# Altium schematic symbol library FPGA_Xilinx_Virtex6.SchLib: 28 symbols (part 5 of 21)
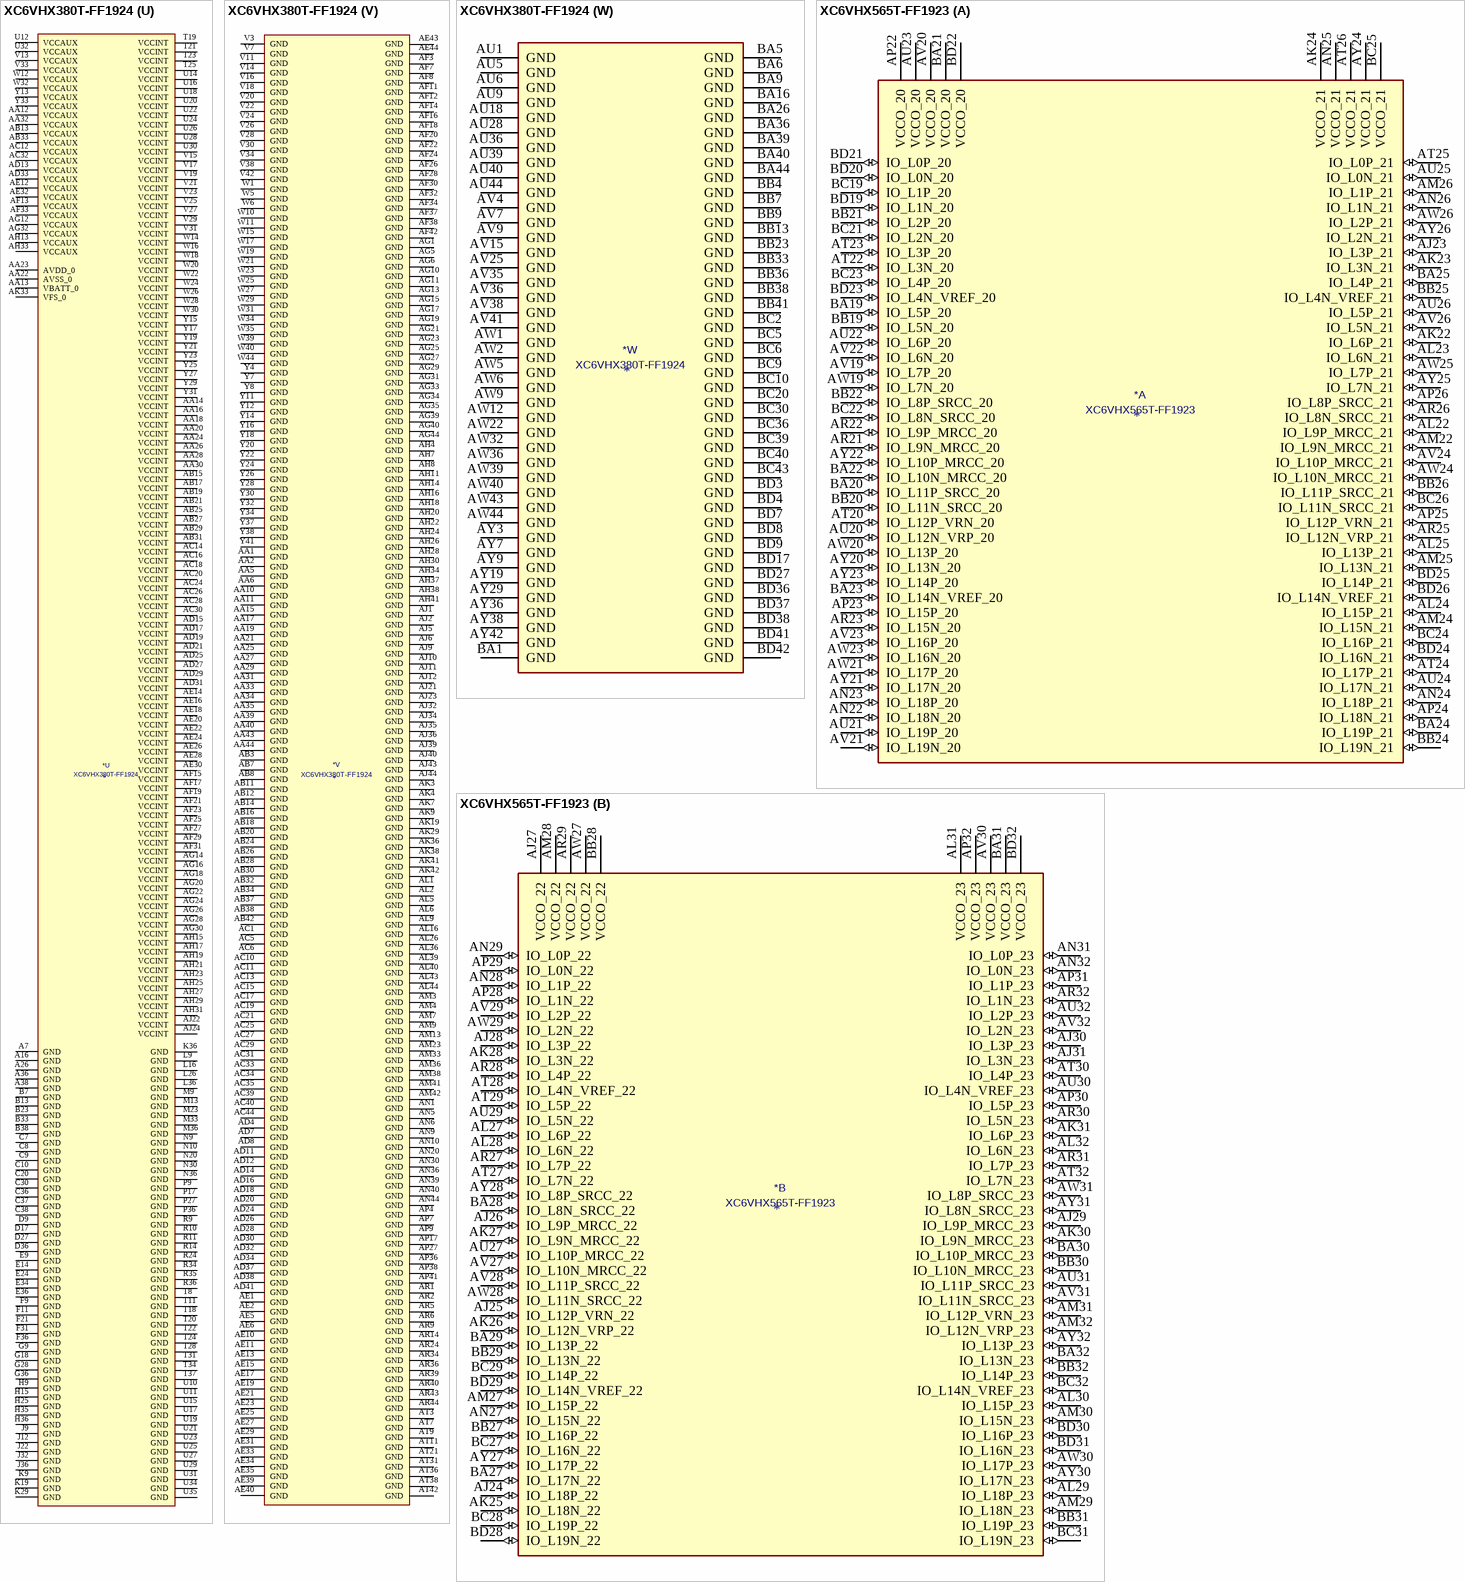
[diagram p105: symbols XC6VHX380T-FF1924 to XC6VHX565T-FF1923]

## XC6VHX380T-FF1924
designator *  value XC6VHX380T-FF1924
ki_keywords: FPGA; ki_description: Virtex 6 HXT 380 XC6VHX380T-FF1924
part A pins: AJ25 IO_L12P_VRN_22 (io), AJ26 IO_L9P_MRCC_22 (io), AJ27 VCCO_22 (power), AJ28 IO_L3P_22 (io), AK23 IO_L3P_21 (io), AK24 VCCO_21 (power), AK25 IO_L18P_22 (io), AK26 IO_L12N_VRP_22 (io), AK27 IO_L9N_MRCC_22 (io), AK28 IO_L3N_22 (io), AL23 IO_L3N_21 (io), AL24 IO_L15P_21 (io), AL25 IO_L18N_22 (io), AL27 IO_L6P_22 (io), AL28 IO_L6N_22 (io), AM24 IO_L15N_21 (io), AM25 IO_L15P_22 (io), AM26 IO_L15N_22 (io), AM27 IO_L0P_22 (io), AM28 VCCO_22 (power), AN23 IO_L6P_21 (io), AN24 IO_L18P_21 (io), AN25 VCCO_21 (power), AN26 IO_L10P_MRCC_22 (io), AN27 IO_L1P_22 (io), AN28 IO_L0N_22 (io), AP23 IO_L6N_21 (io), AP24 IO_L18N_21 (io), AP25 IO_L12P_VRN_21 (io), AP26 IO_L10N_MRCC_22 (io), AP28 IO_L1N_22 (io), AR23 IO_L9P_MRCC_21 (io), AR25 IO_L12N_VRP_21 (io), AR26 IO_L5P_22 (io), AR27 IO_L5N_22 (io), AR28 IO_L2P_22 (io), AT23 IO_L9N_MRCC_21 (io), AT24 IO_L14P_21 (io), AT25 IO_L1P_21 (io), AT26 VCCO_22 (power), AT27 IO_L7P_22 (io), AT28 IO_L2N_22 (io), AU23 VCCO_21 (power), AU24 IO_L14N_VREF_21 (io), AU25 IO_L1N_21 (io), AU26 IO_L0P_21 (io), AU27 IO_L7N_22 (io), AV23 IO_L10P_MRCC_21 (io), AV24 IO_L13P_21 (io), AV26 IO_L0N_21 (io), AV27 IO_L11P_SRCC_22 (io), AV28 IO_L4P_22 (io), AW23 IO_L10N_MRCC_21 (io), AW24 IO_L13N_21 (io), AW25 IO_L2P_21 (io), AW26 IO_L5P_21 (io), AW27 VCCO_22 (power), AW28 IO_L11N_SRCC_22 (io), AW29 IO_L4N_VREF_22 (io), AY23 IO_L11P_SRCC_21 (io), AY24 VCCO_21 (power), AY25 IO_L2N_21 (io), AY26 IO_L5N_21 (io), AY27 IO_L13P_22 (io), AY28 IO_L8P_SRCC_22 (io), BA23 IO_L11N_SRCC_21 (io), BA24 IO_L8P_SRCC_21 (io), BA25 IO_L19P_21 (io), BA27 IO_L16P_22 (io), BA28 IO_L13N_22 (io), BA29 IO_L8N_SRCC_22 (io), BB24 IO_L8N_SRCC_21 (io), BB25 IO_L19N_21 (io), BB26 IO_L7P_21 (io), BB27 IO_L16N_22 (io), BB28 VCCO_22 (power), BB29 IO_L17P_22 (io), BC23 IO_L16P_21 (io), BC24 IO_L17P_21 (io), BC25 VCCO_21 (power), BC26 IO_L7N_21 (io), BC27 IO_L14P_22 (io), BC28 IO_L19P_22 (io), BC29 IO_L17N_22 (io), BD23 IO_L16N_21 (io), BD24 IO_L17N_21 (io), BD25 IO_L4P_21 (io), BD26 IO_L4N_VREF_21 (io), BD28 IO_L14N_VREF_22 (io), BD29 IO_L19N_22 (io)
part B pins: AJ29 IO_L9P_MRCC_23 (io), AJ30 IO_L9N_MRCC_23 (io), AJ31 IO_L3P_23 (io), AK30 IO_L6P_23 (io), AK31 IO_L3N_23 (io), AK34 VCCO_24 (power), AK35 IO_L3P_D13_24 (io), AL29 IO_L12P_VRN_23 (io), AL30 IO_L6N_23 (io), AL31 VCCO_23 (power), AL32 IO_L18P_24 (io), AL33 IO_L9P_MRCC_24 (io), AL34 IO_L6P_D7_24 (io), AL35 IO_L3N_D12_24 (io), AM29 IO_L18P_23 (io), AM30 IO_L12N_VRP_23 (io), AM31 IO_L15P_23 (io), AM32 IO_L18N_24 (io), AM34 IO_L9N_MRCC_24 (io), AM35 IO_L6N_D6_24 (io), AN29 IO_L18N_23 (io), AN31 IO_L15N_23 (io), AN32 IO_L15P_FWE_B_24 (io), AN33 IO_L15N_RS1_24 (io), AN34 IO_L12P_D3_24 (io), AN35 VCCO_24 (power), AP29 IO_L1P_23 (io), AP30 IO_L1N_23 (io), AP31 IO_L0P_23 (io), AP32 VCCO_24 (power), AP33 IO_L0P_GC_24 (io), AP34 IO_L0N_GC_24 (io), AP35 IO_L12N_D2_FS2_24 (io), AR29 VCCO_23 (power), AR30 IO_L4P_23 (io), AR31 IO_L0N_23 (io), AR32 IO_L8P_SRCC_24 (io), AR33 IO_L1P_GC_24 (io), AR35 IO_L2P_D15_24 (io), AT29 IO_L7P_23 (io), AT30 IO_L4N_VREF_23 (io), AT32 IO_L8N_SRCC_24 (io), AT33 IO_L1N_GC_24 (io), AT34 IO_L5P_D9_24 (io), AT35 IO_L2N_D14_24 (io), AU29 IO_L14P_23 (io), AU30 IO_L7N_23 (io), AU31 IO_L2P_23 (io), AU32 IO_L5P_23 (io), AU33 VCCO_24 (power), AU34 IO_L4P_D11_24 (io), AU35 IO_L5N_D8_24 (io), AV29 IO_L14N_VREF_23 (io), AV30 VCCO_23 (power), AV31 IO_L2N_23 (io), AV32 IO_L5N_23 (io), AV33 IO_L7P_D5_24 (io), AV34 IO_L4N_VREF_D10_24 (io), AW30 IO_L16P_23 (io), AW31 IO_L11P_SRCC_23 (io), AW33 IO_L14P_FCS_B_24 (io), AW34 IO_L7N_D4_24 (io), AW35 IO_L10P_MRCC_24 (io), AY30 IO_L16N_23 (io), AY31 IO_L11N_SRCC_23 (io), AY32 IO_L8P_SRCC_23 (io), AY33 IO_L14N_VREF_FOE_B_MOSI_24 (io), AY34 VCCO_24 (power), AY35 IO_L10N_MRCC_24 (io), BA30 IO_L17P_23 (io), BA31 VCCO_23 (power), BA32 IO_L8N_SRCC_23 (io), BA33 IO_L13P_D1_FS1_24 (io), BA34 IO_L13N_D0_FS0_24 (io), BA35 IO_L11P_SRCC_24 (io), BB30 IO_L17N_23 (io), BB31 IO_L10P_MRCC_23 (io), BB32 IO_L13P_23 (io), BB34 IO_L16P_RS0_24 (io), BB35 IO_L11N_SRCC_24 (io), BC31 IO_L10N_MRCC_23 (io), BC32 IO_L13N_23 (io), BC33 IO_L19P_24 (io), BC34 IO_L16N_CSO_B_24 (io), BC35 VCCO_24 (power), BD30 IO_L19P_23 (io), BD31 IO_L19N_23 (io), BD32 VCCO_23 (power), BD33 IO_L19N_24 (io), BD34 IO_L17P_VRN_24 (io), BD35 IO_L17N_VRP_24 (io)
part C pins: A30 IO_L1N_26 (io), A31 VCCO_26 (power), A32 IO_L0N_26 (io), A33 IO_L5N_26 (io), A34 IO_L0P_25 (io), A35 IO_L0N_25 (io), A37 IO_L2N_SM8N_25 (io), B30 IO_L1P_26 (io), B31 IO_L0P_26 (io), B32 IO_L5P_26 (io), B34 IO_L7N_SM12N_25 (io), B35 IO_L1P_25 (io), B36 IO_L1N_25 (io), B37 IO_L2P_SM8P_25 (io), C31 IO_L7N_26 (io), C32 IO_L2P_26 (io), C33 IO_L2N_26 (io), C34 IO_L7P_SM12P_25 (io), C35 VCCO_25 (power), D30 IO_L4N_VREF_26 (io), D31 IO_L7P_26 (io), D32 VCCO_26 (power), D33 IO_L8P_SRCC_25 (io), D34 IO_L8N_SRCC_25 (io), D35 IO_L5N_SM10N_25 (io), E30 IO_L4P_26 (io), E31 IO_L11P_SRCC_26 (io), E32 IO_L11N_SRCC_26 (io), E33 IO_L13N_SM14N_25 (io), E35 IO_L5P_SM10P_25 (io), F30 IO_L13N_26 (io), F32 IO_L8N_SRCC_26 (io), F33 IO_L13P_SM14P_25 (io), F34 IO_L14N_VREF_25 (io), F35 IO_L11N_SRCC_25 (io), G30 IO_L13P_26 (io), G31 IO_L8P_SRCC_26 (io), G32 IO_L17N_26 (io), G33 VCCO_25 (power), G34 IO_L14P_25 (io), G35 IO_L11P_SRCC_25 (io), H30 VCCO_26 (power), H31 IO_L17P_26 (io), H32 IO_L10N_MRCC_26 (io), H33 IO_L19N_GC_25 (io), H34 IO_L17N_25 (io), J30 IO_L19N_26 (io), J31 IO_L10P_MRCC_26 (io), J33 IO_L19P_GC_25 (io), J34 IO_L17P_25 (io), J35 IO_L6N_SM11N_25 (io), K30 IO_L19P_26 (io), K31 IO_L14N_VREF_26 (io), K32 IO_L16N_26 (io), K33 IO_L3N_SM9N_25 (io), K34 VCCO_25 (power), K35 IO_L6P_SM11P_25 (io), L30 IO_L14P_26 (io), L31 VCCO_26 (power), L32 IO_L16P_26 (io), L33 IO_L3P_SM9P_25 (io), L34 IO_L16N_VRP_25 (io), L35 IO_L10N_MRCC_25 (io), M29 IO_L6N_26 (io), M30 IO_L3P_26 (io), M31 IO_L3N_26 (io), M32 IO_L12N_VRP_26 (io), M34 IO_L16P_VRN_25 (io), M35 IO_L10P_MRCC_25 (io), N29 IO_L6P_26 (io), N31 IO_L12P_VRN_26 (io), N32 IO_L12N_SM13N_25 (io), N33 IO_L9P_MRCC_25 (io), N34 IO_L9N_MRCC_25 (io), N35 VCCO_25 (power), P29 IO_L9N_MRCC_26 (io), P30 IO_L15N_26 (io), P31 IO_L12P_SM13P_25 (io), P32 VCCO_25 (power), P33 IO_L15N_SM15N_25 (io), P34 IO_L4P_25 (io), P35 IO_L4N_VREF_25 (io), R28 IO_L9P_MRCC_26 (io), R29 VCCO_26 (power), R30 IO_L15P_26 (io), R31 IO_L18P_GC_25 (io), R32 IO_L18N_GC_25 (io), R33 IO_L15P_SM15P_25 (io), T29 IO_L18P_26 (io), T30 IO_L18N_26 (io)
part D pins: A23 IO_L8P_SRCC_28 (io), A24 IO_L8N_SRCC_28 (io), A25 IO_L7N_28 (io), A27 IO_L0N_27 (io), A28 IO_L1P_27 (io), A29 IO_L1N_27 (io), B24 IO_L5N_28 (io), B25 IO_L7P_28 (io), B26 IO_L2N_28 (io), B27 IO_L0P_27 (io), B28 VCCO_27 (power), B29 IO_L5N_27 (io), C23 IO_L5P_28 (io), C24 IO_L4N_VREF_28 (io), C25 VCCO_28 (power), C26 IO_L2P_28 (io), C27 IO_L2P_27 (io), C28 IO_L2N_27 (io), C29 IO_L5P_27 (io), D23 IO_L4P_28 (io), D24 IO_L1N_28 (io), D25 IO_L10N_MRCC_28 (io), D26 IO_L11N_SRCC_28 (io), D28 IO_L8P_SRCC_27 (io), D29 IO_L8N_SRCC_27 (io), E23 IO_L1P_28 (io), E25 IO_L10P_MRCC_28 (io), E26 IO_L11P_SRCC_28 (io), E27 IO_L4N_VREF_27 (io), E28 IO_L7N_27 (io), E29 VCCO_27 (power), F23 IO_L0P_28 (io), F24 IO_L0N_28 (io), F25 IO_L17N_28 (io), F26 VCCO_28 (power), F27 IO_L4P_27 (io), F28 IO_L7P_27 (io), F29 IO_L10N_MRCC_27 (io), G23 VCCO_28 (power), G24 IO_L17P_28 (io), G25 IO_L14P_28 (io), G26 IO_L14N_VREF_28 (io), G27 IO_L11N_SRCC_27 (io), G29 IO_L10P_MRCC_27 (io), H23 IO_L13N_28 (io), H24 IO_L16N_28 (io), H26 IO_L19N_28 (io), H27 IO_L11P_SRCC_27 (io), H28 IO_L17P_27 (io), H29 IO_L17N_27 (io), J23 IO_L13P_28 (io), J24 IO_L16P_28 (io), J25 IO_L12N_VRP_28 (io), J26 IO_L19P_28 (io), J27 VCCO_27 (power), J28 IO_L19P_27 (io), J29 IO_L19N_27 (io), K23 IO_L3N_28 (io), K24 VCCO_28 (power), K25 IO_L12P_VRN_28 (io), K26 IO_L13P_27 (io), K27 IO_L13N_27 (io), K28 IO_L14N_VREF_27 (io), L23 IO_L3P_28 (io), L24 IO_L6P_28 (io), L25 IO_L6N_28 (io), L27 IO_L14P_27 (io), L28 IO_L16P_27 (io), L29 IO_L16N_27 (io), M24 IO_L9P_MRCC_28 (io), M25 IO_L9N_MRCC_28 (io), M26 IO_L3N_27 (io), M27 IO_L6N_27 (io), M28 VCCO_27 (power), N23 IO_L18P_28 (io), N24 IO_L18N_28 (io), N25 VCCO_28 (power), N26 IO_L3P_27 (io), N27 IO_L6P_27 (io), N28 IO_L15N_27 (io), P23 IO_L15P_28 (io), P24 IO_L15N_28 (io), P25 IO_L9N_MRCC_27 (io), P26 IO_L12N_VRP_27 (io), P28 IO_L15P_27 (io), R25 IO_L9P_MRCC_27 (io), R26 IO_L12P_VRN_27 (io), R27 IO_L18N_27 (io), T26 VCCO_27 (power), T27 IO_L18P_27 (io)
part E pins: AJ17 VCCO_32 (power), AJ18 IO_L6P_32 (io), AJ19 IO_L15N_32 (io), AJ20 IO_L15P_32 (io), AK17 IO_L3P_32 (io), AK18 IO_L6N_32 (io), AK20 IO_L18P_32 (io), AK21 IO_L3N_31 (io), AK22 IO_L3P_31 (io), AL17 IO_L3N_32 (io), AL18 IO_L9N_MRCC_32 (io), AL19 IO_L9P_MRCC_32 (io), AL20 IO_L18N_32 (io), AL21 VCCO_31 (power), AL22 IO_L15P_31 (io), AM17 IO_L0P_32 (io), AM18 VCCO_32 (power), AM19 IO_L12N_VRP_32 (io), AM20 IO_L12P_VRN_32 (io), AM21 IO_L15N_31 (io), AM22 IO_L18P_31 (io), AN17 IO_L0N_32 (io), AN18 IO_L1P_32 (io), AN19 IO_L10P_MRCC_32 (io), AN21 IO_L6P_31 (io), AN22 IO_L18N_31 (io), AP18 IO_L1N_32 (io), AP19 IO_L10N_MRCC_32 (io), AP20 IO_L6N_31 (io), AP21 IO_L9P_MRCC_31 (io), AP22 VCCO_31 (power), AR17 IO_L2N_32 (io), AR18 IO_L2P_32 (io), AR19 VCCO_32 (power), AR20 IO_L9N_MRCC_31 (io), AR21 IO_L12N_VRP_31 (io), AR22 IO_L12P_VRN_31 (io), AT17 IO_L5P_32 (io), AT18 IO_L7N_32 (io), AT19 IO_L7P_32 (io), AT20 IO_L1P_31 (io), AT22 IO_L13P_31 (io), AU17 IO_L5N_32 (io), AU19 IO_L0P_31 (io), AU20 IO_L1N_31 (io), AU21 IO_L14P_31 (io), AU22 IO_L13N_31 (io), AV17 IO_L4P_32 (io), AV18 IO_L11P_SRCC_32 (io), AV19 IO_L0N_31 (io), AV20 VCCO_31 (power), AV21 IO_L14N_VREF_31 (io), AV22 IO_L10P_MRCC_31 (io), AW16 IO_L4N_VREF_32 (io), AW17 VCCO_32 (power), AW18 IO_L11N_SRCC_32 (io), AW19 IO_L2N_31 (io), AW20 IO_L2P_31 (io), AW21 IO_L10N_MRCC_31 (io), AY16 IO_L13N_32 (io), AY17 IO_L13P_32 (io), AY18 IO_L16P_32 (io), AY20 IO_L4P_31 (io), AY21 IO_L19N_31 (io), AY22 IO_L19P_31 (io), BA17 IO_L17P_32 (io), BA18 IO_L16N_32 (io), BA19 IO_L4N_VREF_31 (io), BA20 IO_L5P_31 (io), BA21 VCCO_31 (power), BA22 IO_L11P_SRCC_31 (io), BB16 IO_L17N_32 (io), BB17 IO_L8P_SRCC_32 (io), BB18 VCCO_32 (power), BB19 IO_L7P_31 (io), BB20 IO_L5N_31 (io), BB21 IO_L11N_SRCC_31 (io), BB22 IO_L16P_31 (io), BC16 IO_L8N_SRCC_32 (io), BC17 IO_L19P_32 (io), BC18 IO_L14P_32 (io), BC19 IO_L7N_31 (io), BC21 IO_L17P_31 (io), BC22 IO_L16N_31 (io), BD16 IO_L19N_32 (io), BD18 IO_L14N_VREF_32 (io), BD19 IO_L8N_SRCC_31 (io), BD20 IO_L8P_SRCC_31 (io), BD21 IO_L17N_31 (io), BD22 VCCO_31 (power)
part F pins: AJ14 IO_L3N_33 (io), AJ15 IO_L3P_33 (io), AJ16 IO_L6P_33 (io), AK10 IO_L3P_A13_D29_34 (io), AK13 IO_L15P_A23_34 (io), AK14 VCCO_33 (power), AK15 IO_L9P_MRCC_33 (io), AK16 IO_L6N_33 (io), AL10 IO_L3N_A12_D28_34 (io), AL11 VCCO_34 (power), AL12 IO_L9P_MRCC_34 (io), AL13 IO_L15N_A22_34 (io), AL14 IO_L9N_MRCC_33 (io), AL15 IO_L12P_VRN_33 (io), AM10 IO_L6N_A06_D22_34 (io), AM11 IO_L6P_A07_D23_34 (io), AM12 IO_L9N_MRCC_34 (io), AM14 IO_L15P_33 (io), AM15 IO_L12N_VRP_33 (io), AM16 IO_L18P_33 (io), AN11 IO_L12P_A03_D19_34 (io), AN12 IO_L18N_A16_34 (io), AN13 IO_L18P_A17_34 (io), AN14 IO_L15N_33 (io), AN15 VCCO_33 (power), AN16 IO_L18N_33 (io), AP10 IO_L12N_A02_D18_34 (io), AP11 IO_L0P_GC_34 (io), AP12 VCCO_34 (power), AP13 IO_L8P_SRCC_34 (io), AP14 IO_L1N_33 (io), AP15 IO_L1P_33 (io), AP16 IO_L4P_33 (io), AR10 IO_L2P_A15_D31_34 (io), AR11 IO_L0N_GC_34 (io), AR12 IO_L1P_GC_34 (io), AR13 IO_L8N_SRCC_34 (io), AR15 IO_L0P_33 (io), AR16 IO_L4N_VREF_33 (io), AT10 IO_L2N_A14_D30_34 (io), AT12 IO_L1N_GC_34 (io), AT13 IO_L13P_A01_D17_34 (io), AT14 IO_L0N_33 (io), AT15 IO_L7P_33 (io), AT16 VCCO_33 (power), AU10 IO_L4N_VREF_A10_D26_34 (io), AU11 IO_L4P_A11_D27_34 (io), AU12 IO_L13N_A00_D16_34 (io), AU13 VCCO_33 (power), AU14 IO_L5P_33 (io), AU15 IO_L7N_33 (io), AU16 IO_L14P_33 (io), AV10 VCCO_34 (power), AV11 IO_L5N_A08_D24_34 (io), AV12 IO_L5P_A09_D25_34 (io), AV13 IO_L5N_33 (io), AV14 IO_L2P_33 (io), AV16 IO_L14N_VREF_33 (io), AW10 IO_L10P_MRCC_34 (io), AW11 IO_L7P_A05_D21_34 (io), AW13 IO_L11P_SRCC_33 (io), AW14 IO_L2N_33 (io), AW15 IO_L17P_33 (io), AY10 IO_L10N_MRCC_34 (io), AY11 IO_L7N_A04_D20_34 (io), AY12 IO_L14P_A25_34 (io), AY13 IO_L11N_SRCC_33 (io), AY14 VCCO_33 (power), AY15 IO_L17N_33 (io), BA10 IO_L11P_SRCC_34 (io), BA11 VCCO_34 (power), BA12 IO_L14N_VREF_A24_34 (io), BA13 IO_L8N_SRCC_33 (io), BA14 IO_L8P_SRCC_33 (io), BA15 IO_L16P_33 (io), BB10 IO_L11N_SRCC_34 (io), BB11 IO_L16P_A21_34 (io), BB12 IO_L19P_VRN_34 (io), BB14 IO_L13P_33 (io), BB15 IO_L16N_33 (io), BC11 IO_L16N_A20_34 (io), BC12 IO_L19N_VRP_34 (io), BC13 IO_L13N_33 (io), BC14 IO_L10P_MRCC_33 (io), BC15 VCCO_33 (power), BD10 IO_L17N_A18_34 (io), BD11 IO_L17P_A19_34 (io), BD12 VCCO_34 (power), BD13 IO_L10N_MRCC_33 (io), BD14 IO_L19N_33 (io), BD15 IO_L19P_33 (io)
part G pins: A8 IO_L4N_VREF_35 (io), A9 IO_L7N_SM4N_35 (io), A10 IO_L2N_SM0N_35 (io), A11 VCCO_35 (power), A12 IO_L1N_35 (io), A13 IO_L1P_35 (io), A14 IO_L5N_36 (io), A15 IO_L1N_36 (io), A17 IO_L0N_36 (io), B8 VCCO_35 (power), B9 IO_L4P_35 (io), B10 IO_L7P_SM4P_35 (io), B11 IO_L2P_SM0P_35 (io), B12 IO_L5N_SM2N_35 (io), B14 IO_L5P_36 (io), B15 IO_L1P_36 (io), B16 IO_L2N_36 (io), B17 IO_L0P_36 (io), C11 IO_L0N_35 (io), C12 IO_L0P_35 (io), C13 IO_L5P_SM2P_35 (io), C14 IO_L4N_VREF_36 (io), C15 VCCO_36 (power), C16 IO_L2P_36 (io), D10 IO_L14N_VREF_35 (io), D11 IO_L8N_SRCC_35 (io), D12 VCCO_35 (power), D13 IO_L17N_36 (io), D14 IO_L4P_36 (io), D15 IO_L11N_SRCC_36 (io), D16 IO_L7N_36 (io), E10 IO_L13N_SM6N_35 (io), E11 IO_L14P_35 (io), E12 IO_L8P_SRCC_35 (io), E13 IO_L17P_36 (io), E15 IO_L11P_SRCC_36 (io), E16 IO_L7P_36 (io), F10 IO_L13P_SM6P_35 (io), F12 IO_L10N_MRCC_35 (io), F13 IO_L6N_36 (io), F14 IO_L6P_36 (io), F15 IO_L3N_36 (io), F16 VCCO_36 (power), G10 IO_L6N_SM3N_35 (io), G11 IO_L17N_35 (io), G12 IO_L10P_MRCC_35 (io), G13 VCCO_36 (power), G14 IO_L13N_36 (io), G15 IO_L3P_36 (io), H10 VCCO_35 (power), H11 IO_L6P_SM3P_35 (io), H12 IO_L17P_35 (io), H13 IO_L8N_SRCC_36 (io), H14 IO_L13P_36 (io), J10 IO_L11N_SRCC_35 (io), J11 IO_L9N_MRCC_35 (io), J13 IO_L14N_VREF_36 (io), J14 IO_L8P_SRCC_36 (io), J15 IO_L19N_36 (io), K10 IO_L11P_SRCC_35 (io), K11 IO_L9P_MRCC_35 (io), K12 IO_L16N_VRP_35 (io), K13 IO_L14P_36 (io), K14 VCCO_36 (power), K15 IO_L19P_36 (io), L10 IO_L15N_SM7N_35 (io), L11 VCCO_35 (power), L12 IO_L16P_VRN_35 (io), L13 IO_L18N_36 (io), L14 IO_L18P_36 (io), L15 IO_L16N_36 (io), M10 IO_L18N_GC_35 (io), M11 IO_L15P_SM7P_35 (io), M12 IO_L19N_GC_35 (io), M14 IO_L12N_VRP_36 (io), M15 IO_L16P_36 (io), N11 IO_L18P_GC_35 (io), N12 IO_L19P_GC_35 (io), N13 IO_L10N_MRCC_36 (io), N14 IO_L12P_VRN_36 (io), N15 VCCO_36 (power), P10 IO_L12N_SM5N_35 (io), P11 IO_L12P_SM5P_35 (io), P12 VCCO_35 (power), P13 IO_L10P_MRCC_36 (io), P14 IO_L9N_MRCC_36 (io), P15 IO_L9P_MRCC_36 (io), R12 IO_L3N_SM1N_35 (io), R13 IO_L3P_SM1P_35 (io), R15 IO_L15N_36 (io), T15 IO_L15P_36 (io)
part H pins: A18 IO_L4N_VREF_38 (io), A19 IO_L5N_38 (io), A20 IO_L8N_SRCC_38 (io), A21 VCCO_38 (power), A22 IO_L7N_38 (io), B18 VCCO_38 (power), B19 IO_L4P_38 (io), B20 IO_L5P_38 (io), B21 IO_L8P_SRCC_38 (io), B22 IO_L7P_38 (io), C17 IO_L5N_37 (io), C18 IO_L5P_37 (io), C19 IO_L1N_37 (io), C21 IO_L1N_38 (io), C22 IO_L1P_38 (io), D18 IO_L2N_37 (io), D19 IO_L1P_37 (io), D20 IO_L11N_SRCC_38 (io), D21 IO_L2N_38 (io), D22 VCCO_38 (power), E17 IO_L4N_VREF_37 (io), E18 IO_L2P_37 (io), E19 VCCO_37 (power), E20 IO_L16N_38 (io), E21 IO_L11P_SRCC_38 (io), E22 IO_L2P_38 (io), F17 IO_L4P_37 (io), F18 IO_L7N_37 (io), F19 IO_L7P_37 (io), F20 IO_L16P_38 (io), F22 IO_L13N_38 (io), G16 IO_L13N_37 (io), G17 IO_L8N_SRCC_37 (io), G19 IO_L0N_37 (io), G20 IO_L17N_38 (io), G21 IO_L10N_MRCC_38 (io), G22 IO_L13P_38 (io), H16 IO_L14N_VREF_37 (io), H17 IO_L13P_37 (io), H18 IO_L8P_SRCC_37 (io), H19 IO_L0P_37 (io), H20 VCCO_38 (power), H21 IO_L17P_38 (io), H22 IO_L10P_MRCC_38 (io), J16 IO_L14P_37 (io), J17 VCCO_37 (power), J18 IO_L11N_SRCC_37 (io), J19 IO_L11P_SRCC_37 (io), J20 IO_L19N_38 (io), J21 IO_L0N_38 (io), K16 IO_L17N_37 (io), K17 IO_L17P_37 (io), K18 IO_L10N_MRCC_37 (io), K20 IO_L14N_VREF_38 (io), K21 IO_L19P_38 (io), K22 IO_L0P_38 (io), L17 IO_L18N_37 (io), L18 IO_L10P_MRCC_37 (io), L19 IO_L3N_37 (io), L20 IO_L14P_38 (io), L21 VCCO_38 (power), L22 IO_L3N_38 (io), M16 IO_L16N_37 (io), M17 IO_L18P_37 (io), M18 VCCO_37 (power), M19 IO_L3P_37 (io), M20 IO_L6N_38 (io), M21 IO_L6P_38 (io), M22 IO_L3P_38 (io), N16 IO_L16P_37 (io), N17 IO_L12N_VRP_37 (io), N18 IO_L12P_VRN_37 (io), N19 IO_L6N_37 (io), N21 IO_L9N_MRCC_38 (io), N22 IO_L9P_MRCC_38 (io), P16 IO_L19N_37 (io), P18 IO_L9N_MRCC_37 (io), P19 IO_L6P_37 (io), P20 IO_L12N_VRP_38 (io), P21 IO_L18N_38 (io), P22 VCCO_38 (power), R16 IO_L19P_37 (io), R17 IO_L15N_37 (io), R18 IO_L9P_MRCC_37 (io), R19 VCCO_37 (power), R20 IO_L12P_VRN_38 (io), R21 IO_L18P_38 (io), R22 IO_L15N_38 (io), R23 IO_L15P_38 (io), T16 VCCO_37 (power), T17 IO_L15P_37 (io)
part I pins: AP39 MGTRXN3_101 (io), AP40 MGTRXP3_101 (io), AP43 MGTTXN3_101 (io), AP44 MGTTXP3_101 (io), AR37 MGTREFCLK1P_101 (io), AR38 MGTREFCLK1N_101 (io), AR41 MGTTXN2_101 (io), AR42 MGTTXP2_101 (io), AT39 MGTRXN2_101 (io), AT40 MGTRXP2_101 (io), AT43 MGTTXN1_101 (io), AT44 MGTTXP1_101 (io), AU37 MGTREFCLK0P_101 (io), AU38 MGTREFCLK0N_101 (io), AU41 MGTTXN0_101 (io), AU42 MGTTXP0_101 (io), AV39 MGTRXN1_101 (io), AV40 MGTRXP1_101 (io), AV43 MGTTXN3_100 (io), AV44 MGTTXP3_100 (io), AW37 MGTREFCLK1P_100 (io), AW38 MGTREFCLK1N_100 (io), AW41 MGTTXN2_100 (io), AW42 MGTTXP2_100 (io), AY39 MGTRXN0_101 (io), AY40 MGTRXP0_101 (io), AY43 MGTTXN1_100 (io), AY44 MGTTXP1_100 (io), BA37 MGTREFCLK0P_100 (io), BA38 MGTREFCLK0N_100 (io), BA41 MGTRXN3_100 (io), BA42 MGTRXP3_100 (io), BB39 MGTRXN2_100 (io), BB40 MGTRXP2_100 (io), BB43 MGTTXN0_100 (io), BB44 MGTTXP0_100 (io), BC41 MGTRXN1_100 (io), BC42 MGTRXP1_100 (io), BD39 MGTRXN0_100 (io), BD40 MGTRXP0_100 (io)
part J pins: AD35 MGTREFCLK1P_103 (io), AD36 MGTREFCLK1N_103 (io), AE37 MGTRXN3_103 (io), AE38 MGTRXP3_103 (io), AF35 MGTREFCLK0P_103 (io), AF36 MGTREFCLK0N_103 (io), AF39 MGTRXN2_103 (io), AF40 MGTRXP2_103 (io), AF43 MGTTXN3_103 (io), AF44 MGTTXP3_103 (io), AG37 MGTRXN1_103 (io), AG38 MGTRXP1_103 (io), AG41 MGTTXN2_103 (io), AG42 MGTTXP2_103 (io), AH35 MGTREFCLK1P_102 (io), AH36 MGTREFCLK1N_102 (io), AH39 MGTRXN0_103 (io), AH40 MGTRXP0_103 (io), AH43 MGTTXN1_103 (io), AH44 MGTTXP1_103 (io), AJ37 MGTRXN2_102 (io), AJ38 MGTRXP2_102 (io), AJ41 MGTTXN0_103 (io), AJ42 MGTTXP0_103 (io), AK39 MGTRXN3_102 (io), AK40 MGTRXP3_102 (io), AK43 MGTTXN3_102 (io), AK44 MGTTXP3_102 (io), AL37 MGTRXN0_102 (io), AL38 MGTRXP0_102 (io), AL41 MGTTXN2_102 (io), AL42 MGTTXP2_102 (io), AM39 MGTRXN1_102 (io), AM40 MGTRXP1_102 (io), AM43 MGTTXN1_102 (io), AM44 MGTTXP1_102 (io), AN37 MGTREFCLK0P_102 (io), AN38 MGTREFCLK0N_102 (io), AN41 MGTTXN0_102 (io), AN42 MGTTXP0_102 (io)
part K pins: AA37 MGTRXN3_104 (io), AA38 MGTRXP3_104 (io), AA41 MGTTXN0_105 (io), AA42 MGTTXP0_105 (io), AB35 MGTREFCLK0P_104 (io), AB36 MGTREFCLK0N_104 (io), AB39 MGTRXN2_104 (io), AB40 MGTRXP2_104 (io), AB43 MGTTXN3_104 (io), AB44 MGTTXP3_104 (io), AC37 MGTRXN1_104 (io), AC38 MGTRXP1_104 (io), AC41 MGTTXN2_104 (io), AC42 MGTTXP2_104 (io), AD39 MGTRXN0_104 (io), AD40 MGTRXP0_104 (io), AD43 MGTTXN1_104 (io), AD44 MGTTXP1_104 (io), AE41 MGTTXN0_104 (io), AE42 MGTTXP0_104 (io), T35 MGTREFCLK1P_105 (io), T36 MGTREFCLK1N_105 (io), U37 MGTRXN3_105 (io), U38 MGTRXP3_105 (io), V35 MGTREFCLK0P_105 (io), V36 MGTREFCLK0N_105 (io), V39 MGTRXN2_105 (io), V40 MGTRXP2_105 (io), V43 MGTTXN3_105 (io), V44 MGTTXP3_105 (io), W37 MGTRXN1_105 (io), W38 MGTRXP1_105 (io), W41 MGTTXN2_105 (io), W42 MGTTXP2_105 (io), Y35 MGTREFCLK1P_104 (io), Y36 MGTREFCLK1N_104 (io), Y39 MGTRXN0_105 (io), Y40 MGTRXP0_105 (io), Y43 MGTTXN1_105 (io), Y44 MGTTXP1_105 (io)
part L pins: E37 MGTRBIAS_107 (io), G41 MGTTXP2_107 (io), G42 MGTTXN2_107 (io), H39 MGTRXP2_107 (io), H40 MGTRXN2_107 (io), H43 MGTTXP3_107 (io), H44 MGTTXN3_107 (io), J37 MGTRXP3_107 (io), J38 MGTRXN3_107 (io), J41 MGTREFCLKP_107 (io), J42 MGTREFCLKN_107 (io), K39 MGTRXP0_107 (io), K40 MGTRXN0_107 (io), K43 MGTTXP1_107 (io), K44 MGTTXN1_107 (io), L37 MGTRXP1_107 (io), L38 MGTRXN1_107 (io), L41 MGTTXP0_107 (io), L42 MGTTXN0_107 (io), M39 MGTRXP3_106 (io), M40 MGTRXN3_106 (io), M43 MGTTXP2_106 (io), M44 MGTTXN2_106 (io), N37 MGTRXP2_106 (io), N38 MGTRXN2_106 (io), N41 MGTTXP3_106 (io), N42 MGTTXN3_106 (io), P43 MGTTXP1_106 (io), P44 MGTTXN1_106 (io), R38 MGTRBIAS_106 (io), R41 MGTREFCLKP_106 (io), R42 MGTREFCLKN_106 (io), T39 MGTRXP1_106 (io), T40 MGTRXN1_106 (io), T43 MGTTXP0_106 (io), T44 MGTTXN0_106 (io), U41 MGTRXP0_106 (io), U42 MGTRXN0_106 (io)
part M pins: A41 MGTTXP2_108 (io), A42 MGTTXN2_108 (io), AV1 MGTTXP3_110 (io), AV2 MGTTXN3_110 (io), AW3 MGTTXP2_110 (io), AW4 MGTTXN2_110 (io), AW7 MGTREFCLK1N_110 (io), AW8 MGTREFCLK1P_110 (io), AY1 MGTTXP1_110 (io), AY2 MGTTXN1_110 (io), B39 MGTRXP2_108 (io), B40 MGTRXN2_108 (io), BA3 MGTRXP3_110 (io), BA4 MGTRXN3_110 (io), BA7 MGTREFCLK0N_110 (io), BA8 MGTREFCLK0P_110 (io), BB1 MGTTXP0_110 (io), BB2 MGTTXN0_110 (io), BB5 MGTRXP2_110 (io), BB6 MGTRXN2_110 (io), BC3 MGTRXP1_110 (io), BC4 MGTRXN1_110 (io), BD5 MGTRXP0_110 (io), BD6 MGTRXN0_110 (io), C41 MGTTXP3_108 (io), C42 MGTTXN3_108 (io), D37 MGTRBIAS_108 (io), D39 MGTRXP3_108 (io), D40 MGTRXN3_108 (io), D43 MGTTXP1_108 (io), D44 MGTTXN1_108 (io), E41 MGTREFCLKP_108 (io), E42 MGTREFCLKN_108 (io), F39 MGTRXP1_108 (io), F40 MGTRXN1_108 (io), F43 MGTTXP0_108 (io), F44 MGTTXN0_108 (io), G37 MGTRXP0_108 (io), G38 MGTRXN0_108 (io)
part N pins: AH9 MGTREFCLK1N_112 (io), AH10 MGTREFCLK1P_112 (io), AJ7 MGTRXP2_112 (io), AJ8 MGTRXN2_112 (io), AK1 MGTTXP3_112 (io), AK2 MGTTXN3_112 (io), AK5 MGTRXP3_112 (io), AK6 MGTRXN3_112 (io), AL3 MGTTXP2_112 (io), AL4 MGTTXN2_112 (io), AL7 MGTRXP0_112 (io), AL8 MGTRXN0_112 (io), AM1 MGTTXP1_112 (io), AM2 MGTTXN1_112 (io), AM5 MGTRXP1_112 (io), AM6 MGTRXN1_112 (io), AN3 MGTTXP0_112 (io), AN4 MGTTXN0_112 (io), AN7 MGTREFCLK0N_112 (io), AN8 MGTREFCLK0P_112 (io), AP1 MGTTXP3_111 (io), AP2 MGTTXN3_111 (io), AP5 MGTRXP3_111 (io), AP6 MGTRXN3_111 (io), AR3 MGTTXP2_111 (io), AR4 MGTTXN2_111 (io), AR7 MGTREFCLK1N_111 (io), AR8 MGTREFCLK1P_111 (io), AT1 MGTTXP1_111 (io), AT2 MGTTXN1_111 (io), AT5 MGTRXP2_111 (io), AT6 MGTRXN2_111 (io), AU3 MGTTXP0_111 (io), AU4 MGTTXN0_111 (io), AU7 MGTREFCLK0N_111 (io), AU8 MGTREFCLK0P_111 (io), AV5 MGTRXP1_111 (io), AV6 MGTRXN1_111 (io), AY5 MGTRXP0_111 (io), AY6 MGTRXN0_111 (io)
part O pins: AA7 MGTRXP3_114 (io), AA8 MGTRXN3_114 (io), AB1 MGTTXP3_114 (io), AB2 MGTTXN3_114 (io), AB5 MGTRXP2_114 (io), AB6 MGTRXN2_114 (io), AB9 MGTREFCLK0N_114 (io), AB10 MGTREFCLK0P_114 (io), AC3 MGTTXP2_114 (io), AC4 MGTTXN2_114 (io), AC7 MGTRXP1_114 (io), AC8 MGTRXN1_114 (io), AD1 MGTTXP1_114 (io), AD2 MGTTXN1_114 (io), AD5 MGTRXP0_114 (io), AD6 MGTRXN0_114 (io), AD9 MGTREFCLK1N_113 (io), AD10 MGTREFCLK1P_113 (io), AE3 MGTTXP0_114 (io), AE4 MGTTXN0_114 (io), AE7 MGTRXP3_113 (io), AE8 MGTRXN3_113 (io), AF1 MGTTXP3_113 (io), AF2 MGTTXN3_113 (io), AF5 MGTRXP2_113 (io), AF6 MGTRXN2_113 (io), AF9 MGTREFCLK0N_113 (io), AF10 MGTREFCLK0P_113 (io), AG3 MGTTXP2_113 (io), AG4 MGTTXN2_113 (io), AG7 MGTRXP1_113 (io), AG8 MGTRXN1_113 (io), AH1 MGTTXP1_113 (io), AH2 MGTTXN1_113 (io), AH5 MGTRXP0_113 (io), AH6 MGTRXN0_113 (io), AJ3 MGTTXP0_113 (io), AJ4 MGTTXN0_113 (io), Y9 MGTREFCLK1N_114 (io), Y10 MGTREFCLK1P_114 (io)
part P pins: AA3 MGTTXP0_115 (io), AA4 MGTTXN0_115 (io), M1 MGTTXN2_116 (io), M2 MGTTXP2_116 (io), M5 MGTRXN3_116 (io), M6 MGTRXP3_116 (io), N3 MGTTXN3_116 (io), N4 MGTTXP3_116 (io), N7 MGTRXN2_116 (io), N8 MGTRXP2_116 (io), P1 MGTTXN1_116 (io), P2 MGTTXP1_116 (io), R3 MGTREFCLKN_116 (io), R4 MGTREFCLKP_116 (io), R7 MGTRBIAS_116 (io), T1 MGTTXN0_116 (io), T2 MGTTXP0_116 (io), T5 MGTRXN1_116 (io), T6 MGTRXP1_116 (io), T9 MGTREFCLK1N_115 (io), T10 MGTREFCLK1P_115 (io), U3 MGTRXN0_116 (io), U4 MGTRXP0_116 (io), U7 MGTRXP3_115 (io), U8 MGTRXN3_115 (io), V1 MGTTXP3_115 (io), V2 MGTTXN3_115 (io), V5 MGTRXP2_115 (io), V6 MGTRXN2_115 (io), V9 MGTREFCLK0N_115 (io), V10 MGTREFCLK0P_115 (io), W3 MGTTXP2_115 (io), W4 MGTTXN2_115 (io), W7 MGTRXP1_115 (io), W8 MGTRXN1_115 (io), Y1 MGTTXP1_115 (io), Y2 MGTTXN1_115 (io), Y5 MGTRXP0_115 (io), Y6 MGTRXN0_115 (io)
part Q pins: A3 MGTTXN2_118 (io), A4 MGTTXP2_118 (io), B5 MGTRXN2_118 (io), B6 MGTRXP2_118 (io), C3 MGTTXN3_118 (io), C4 MGTTXP3_118 (io), D1 MGTTXN1_118 (io), D2 MGTTXP1_118 (io), D5 MGTRXN3_118 (io), D6 MGTRXP3_118 (io), D8 MGTRBIAS_118 (io), E3 MGTREFCLKN_118 (io), E4 MGTREFCLKP_118 (io), E8 MGTRBIAS_117 (io), F1 MGTTXN0_118 (io), F2 MGTTXP0_118 (io), F5 MGTRXN1_118 (io), F6 MGTRXP1_118 (io), G3 MGTTXN2_117 (io), G4 MGTTXP2_117 (io), G7 MGTRXN0_118 (io), G8 MGTRXP0_118 (io), H1 MGTTXN3_117 (io), H2 MGTTXP3_117 (io), H5 MGTRXN2_117 (io), H6 MGTRXP2_117 (io), J3 MGTREFCLKN_117 (io), J4 MGTREFCLKP_117 (io), J7 MGTRXN3_117 (io), J8 MGTRXP3_117 (io), K1 MGTTXN1_117 (io), K2 MGTTXP1_117 (io), K5 MGTRXN0_117 (io), K6 MGTRXP0_117 (io), L3 MGTTXN0_117 (io), L4 MGTTXP0_117 (io), L7 MGTRXN1_117 (io), L8 MGTRXP1_117 (io)
part R pins: AA9 MGTAVCC_RN (power), AA36 MGTAVCC_LN (power), AB4 MGTAVTT_RN (power), AB41 MGTAVTT_LN (power), AC2 MGTAVTT_RN (power), AC9 MGTAVCC_RN (power), AC36 MGTAVCC_LN (power), AC43 MGTAVTT_LN (power), AD3 MGTAVTT_RN (power), AD42 MGTAVTT_LN (power), AE9 MGTAVCC_RN (power), AE36 MGTAVCC_LN (power), AF4 MGTAVTT_RN (power), AF41 MGTAVTT_LN (power), AG2 MGTAVTT_RN (power), AG9 MGTAVCC_RN (power), AG36 MGTAVCC_LN (power), AG43 MGTAVTT_LN (power), AH3 MGTAVTT_RN (power), AH42 MGTAVTT_LN (power), AK8 MGTAVCC_RS (power), AK37 MGTAVCC_LS (power), AM8 MGTAVCC_RS (power), AM37 MGTAVCC_LS (power), AN2 MGTAVTT_RS (power), AN43 MGTAVTT_LS (power), AP3 MGTAVTT_RS (power), AP8 MGTAVCC_RS (power), AP37 MGTAVCC_LS (power), AP42 MGTAVTT_LS (power), AT4 MGTAVTT_RS (power), AT8 MGTAVCC_RS (power), AT37 MGTAVCC_LS (power), AT41 MGTAVTT_LS (power), AU2 MGTAVTT_RS (power), AU43 MGTAVTT_LS (power), AV3 MGTAVTT_RS (power), AV8 MGTAVCC_RS (power), AV37 MGTAVCC_LS (power), AV42 MGTAVTT_LS (power), AY4 MGTAVTT_RS (power), AY8 MGTAVCC_RS (power), AY37 MGTAVCC_LS (power), AY41 MGTAVTT_LS (power), BA2 MGTAVTT_RS (power), BA43 MGTAVTT_LS (power), BB3 MGTAVTT_RS (power), BB8 MGTAVCC_RS (power), BB37 MGTAVCC_LS (power), BB42 MGTAVTT_LS (power), BC7 MGTRREF_115 (power), BC8 MGTAVTTRCAL_115 (power), BC37 MGTAVTTRCAL_105 (power), BC38 MGTRREF_105 (power), U9 MGTAVCC_RN (power), U36 MGTAVCC_LN (power), V8 MGTAVCC_RN (power), V37 MGTAVCC_LN (power), W2 MGTAVTT_RN (power), W9 MGTAVCC_RN (power), W36 MGTAVCC_LN (power), W43 MGTAVTT_LN (power), Y3 MGTAVTT_RN (power), Y42 MGTAVTT_LN (power)
part S pins: A5 MGTHAGND_R (power), A6 MGTHAVCCRX_R (power), A39 MGTHAVCCRX_L (power), A40 MGTHAGND_L (power), B2 MGTHAGND_R (power), B3 MGTHAGND_R (power), B4 MGTHAVCC_R (power), B41 MGTHAVCC_L (power), B42 MGTHAGND_L (power), B43 MGTHAGND_L (power), C1 MGTHAGND_R (power), C2 MGTHAGND_R (power), C5 MGTHAGND_R (power), C6 MGTHAVCCRX_R (power), C39 MGTHAVCCRX_L (power), C40 MGTHAGND_L (power), C43 MGTHAGND_L (power), C44 MGTHAGND_L (power), D3 MGTHAGND_R (power), D4 MGTHAVCC_R (power), D7 MGTHAGND_R (power), D38 MGTHAGND_L (power), D41 MGTHAVCC_L (power), D42 MGTHAGND_L (power), E1 MGTHAGND_R (power), E2 MGTHAVTT_R (power), E5 MGTHAGND_R (power), E6 MGTHAVCC_R (power), E7 MGTHAGND_R (power), E38 MGTHAGND_L (power), E39 MGTHAVCC_L (power), E40 MGTHAGND_L (power), E43 MGTHAVTT_L (power), E44 MGTHAGND_L (power), F3 MGTHAGND_R (power), F4 MGTHAVCC_R (power), F7 MGTHAGND_R (power), F8 MGTHAVCCRX_R (power), F37 MGTHAVCCRX_L (power), F38 MGTHAGND_L (power), F41 MGTHAVCC_L (power), F42 MGTHAGND_L (power), G1 MGTHAGND_R (power), G2 MGTHAGND_R (power), G5 MGTHAGND_R (power), G6 MGTHAVCCRX_R (power), G39 MGTHAVCCRX_L (power), G40 MGTHAGND_L (power), G43 MGTHAGND_L (power), G44 MGTHAGND_L (power), H3 MGTHAGND_R (power), H4 MGTHAVCC_R (power), H7 MGTHAGND_R (power), H8 MGTHAVCCPLL_R (power), H37 MGTHAVCCPLL_L (power), H38 MGTHAGND_L (power), H41 MGTHAVCC_L (power), H42 MGTHAGND_L (power), J1 MGTHAGND_R (power), J2 MGTHAVTT_R (power), J5 MGTHAGND_R (power), J6 MGTHAVCCRX_R (power), J39 MGTHAVCCRX_L (power), J40 MGTHAGND_L (power), J43 MGTHAVTT_L (power), J44 MGTHAGND_L (power), K3 MGTHAGND_R (power), K4 MGTHAVCC_R (power), K7 MGTHAGND_R (power), K8 MGTHAVCCPLL_R (power), K37 MGTHAVCCPLL_L (power), K38 MGTHAGND_L (power), K41 MGTHAVCC_L (power), K42 MGTHAGND_L (power), L1 MGTHAGND_R (power), L2 MGTHAVTT_R (power), L5 MGTHAGND_R (power), L6 MGTHAVCCRX_R (power), L39 MGTHAVCCRX_L (power), L40 MGTHAGND_L (power), L43 MGTHAVTT_L (power), L44 MGTHAGND_L (power), M3 MGTHAGND_R (power), M4 MGTHAVCC_R (power), M7 MGTHAGND_R (power), M8 MGTHAVCCPLL_R (power), M37 MGTHAVCCPLL_L (power), M38 MGTHAGND_L (power), M41 MGTHAVCC_L (power), M42 MGTHAGND_L (power), N1 MGTHAGND_R (power), N2 MGTHAGND_R (power), N5 MGTHAGND_R (power), N6 MGTHAVCC_R (power), N39 MGTHAVCC_L (power), N40 MGTHAGND_L (power), N43 MGTHAGND_L (power), N44 MGTHAGND_L (power), P3 MGTHAGND_R (power), P4 MGTHAVCC_R (power), P7 MGTHAGND_R (power), P8 MGTHAVCCRX_R (power), P37 MGTHAVCCRX_L (power), P38 MGTHAGND_L (power), P41 MGTHAVCC_L (power), P42 MGTHAGND_L (power), R1 MGTHAGND_R (power), R2 MGTHAVTT_R (power), R5 MGTHAGND_R (power), R6 MGTHAVCCRX_R (power), R39 MGTHAVCCRX_L (power), R40 MGTHAGND_L (power), R43 MGTHAVTT_L (power), R44 MGTHAGND_L (power), T3 MGTHAGND_R (power), T4 MGTHAVCC_R (power), T7 MGTHAGND_R (power), T38 MGTHAGND_L (power), T41 MGTHAVCC_L (power), T42 MGTHAGND_L (power), U1 MGTHAGND_R (power), U2 MGTHAGND_R (power), U5 MGTHAGND_R (power), U6 MGTHAGND_R (power), U39 MGTHAGND_L (power), U40 MGTHAGND_L (power), U43 MGTHAGND_L (power), U44 MGTHAGND_L (power), V4 MGTHAGND_R (power), V41 MGTHAGND_L (power)